# Altium schematic symbol library 724452_RPL-HX_Mobile_AEP_Rev0p91_Library.SchLib: 162 symbols (part 2 of 5)
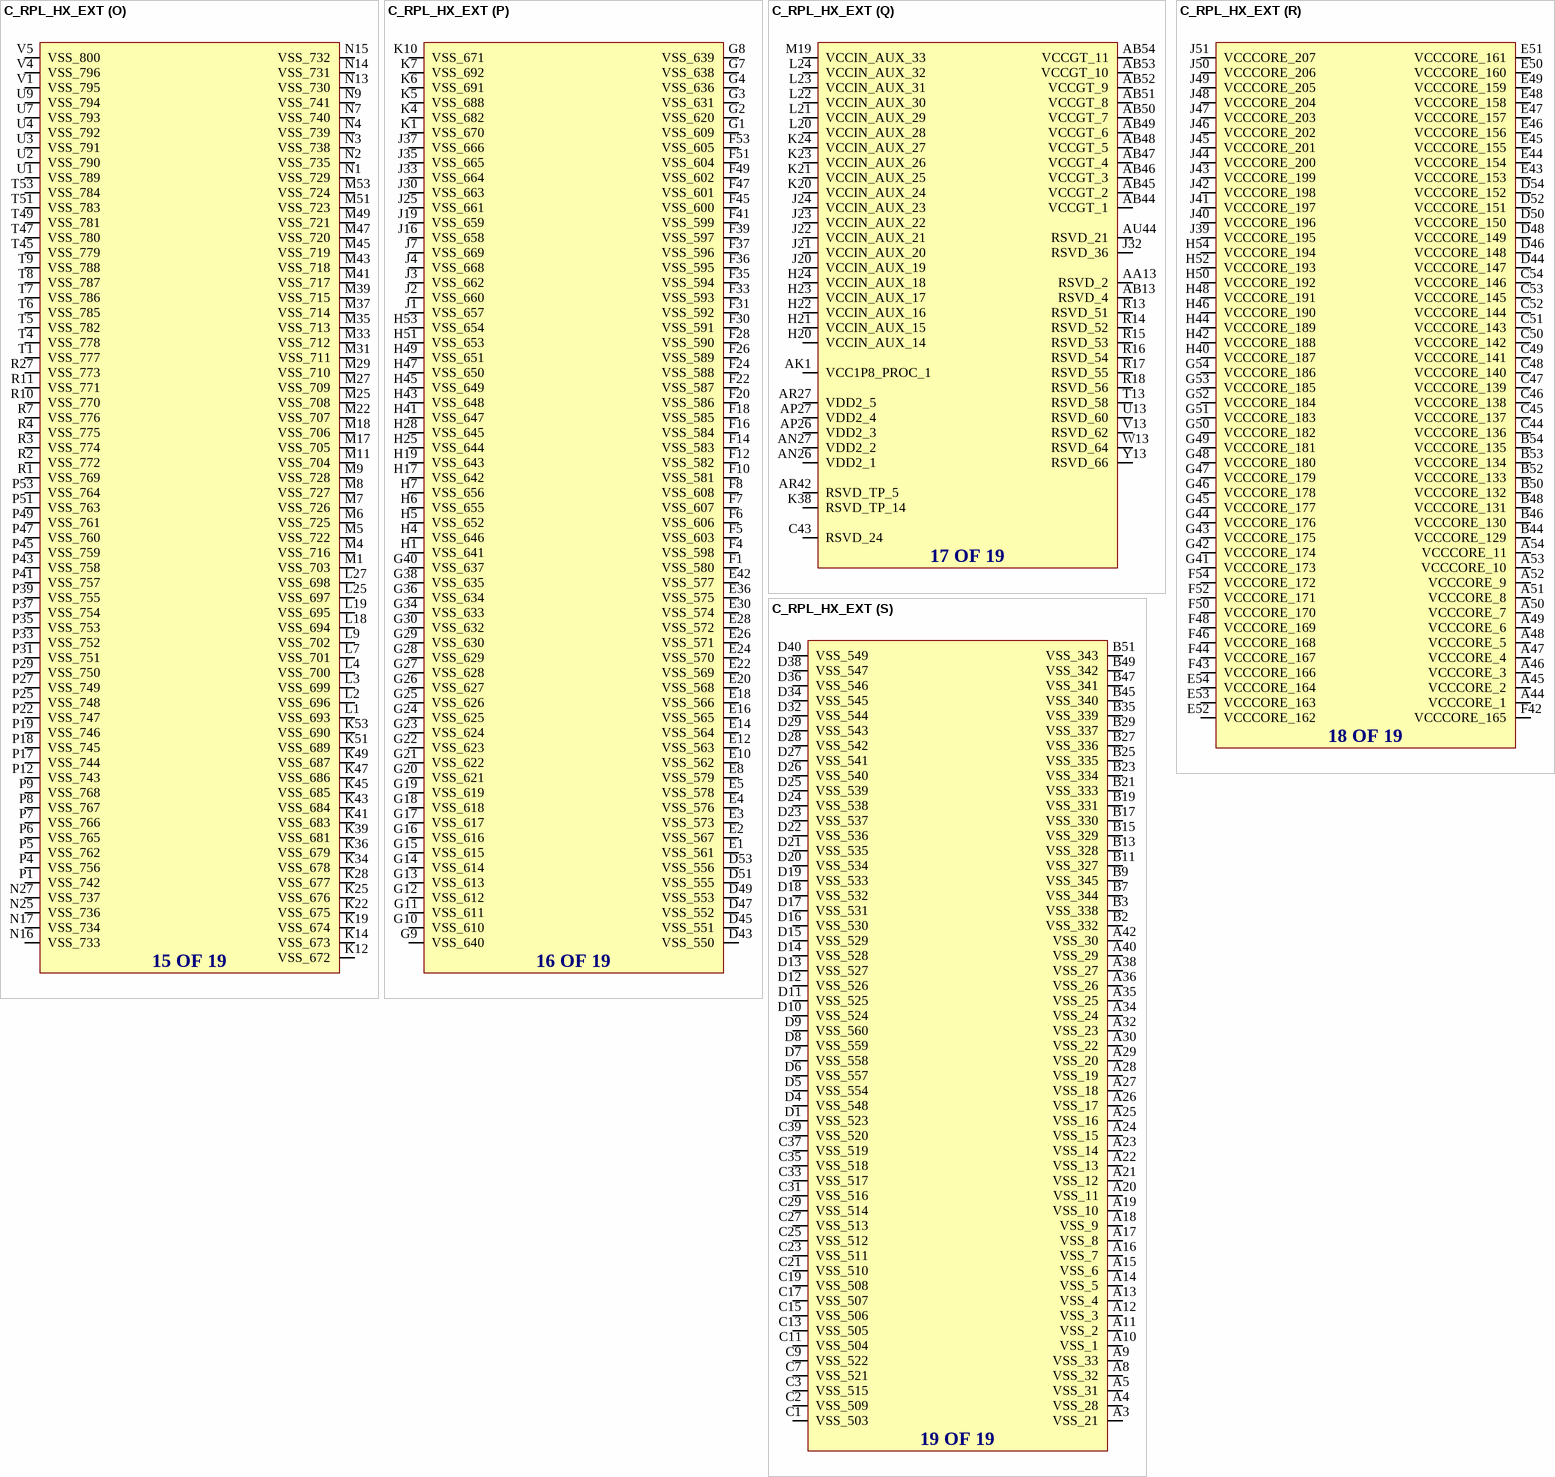
[diagram p44: symbol C_RPL_HX_EXT]

## C_RPL_HX_EXT
designator ?  (value not drawn)
Manufacturer Part Number: *; Case/Package: *
part A pins: AK52 DDR_VREF_CA1, AK54 DDR_VREF_CA0, AM51 DDR0_DQ0_2/DDR0_DQ0_2/DDR0_DQ0_2, AM52 DDR0_DQ0_3/DDR0_DQ0_3/DDR0_DQ0_3, AM53 DDR0_DQ0_1/DDR0_DQ0_1/DDR0_DQ0_1, AN2 DDR0_DQ7_6/DDR1_DQ5_6/DDR1_DQ3_6, AN3 DDR0_DQ7_5/DDR1_DQ5_5/DDR1_DQ3_5, AN4 DDR0_DQ7_4/DDR1_DQ5_4/DDR1_DQ3_4, AN51 DDR0_DQSN0/DDR0_DQSN0/DDR0_DQSN0, AN53 DDR0_DQ0_0/DDR0_DQ0_0/DDR0_DQ0_0, AP2 DDR0_DQ7_7/DDR1_DQ5_7/DDR1_DQ3_7, AP4 DDR0_DQSP7/DDR1_DQSP5/DDR1_DQSP3, AP51 DDR0_DQSP0/DDR0_DQSP0/DDR0_DQSP0, AP53 DDR0_DQ0_5/DDR0_DQ0_5/DDR0_DQ0_5, AR2 DDR0_DQ7_2/DDR1_DQ5_2/DDR1_DQ3_2, AR4 DDR0_DQSN7/DDR1_DQSN5/DDR1_DQSN3, AR51 DDR0_DQ0_6/DDR0_DQ0_6/DDR0_DQ0_6, AR52 DDR0_DQ0_7/DDR0_DQ0_7/DDR0_DQ0_7, AR53 DDR0_DQ0_4/DDR0_DQ0_4/DDR0_DQ0_4, AT2 DDR0_DQ7_3/DDR1_DQ5_3/DDR1_DQ3_3, AT3 DDR0_DQ7_0/DDR1_DQ5_0/DDR1_DQ3_0, AT4 DDR0_DQ7_1/DDR1_DQ5_1/DDR1_DQ3_1, AT25 NC/DDR1_CLKP3, AT26 DDR0_ALERT#, AT31 NC/DDR0_CLKP3, AU24 NC/DDR1_CLKP2, AU25 NC/DDR1_CLKN3, AU31 NC/DDR0_CLKN3, AU32 NC/DDR0_CLKP2, AU51 DDR0_DQ1_2/DDR0_DQ1_2/DDR0_DQ1_2, AU52 DDR0_DQ1_3/DDR0_DQ1_3/DDR0_DQ1_3, AU53 DDR0_DQ1_1/DDR0_DQ1_1/DDR0_DQ1_1, AV2 DDR0_DQ6_6/DDR1_DQ4_6/DDR1_DQ2_6, AV3 DDR0_DQ6_4/DDR1_DQ4_4/DDR1_DQ2_4, AV4 DDR0_DQ6_5/DDR1_DQ4_5/DDR1_DQ2_5, AV24 NC/DDR1_CLKN2, AV32 NC/DDR0_CLKN2, AV51 DDR0_DQSN1/DDR0_DQSN1/DDR0_DQSN1, AV53 DDR0_DQ1_0/DDR0_DQ1_0/DDR0_DQ1_0, AW2 DDR0_DQ6_7/DDR1_DQ4_7/DDR1_DQ2_7, AW4 DDR0_DQSP6/DDR1_DQSP4/DDR1_DQSP2, AW51 DDR0_DQSP1/DDR0_DQSP1/DDR0_DQSP1, AW53 DDR0_DQ1_4/DDR0_DQ1_4/DDR0_DQ1_4, AY2 DDR0_DQ6_2/DDR1_DQ4_2/DDR1_DQ2_2, AY4 DDR0_DQSN6/DDR1_DQSN4/DDR1_DQSN2, AY51 DDR0_DQ1_6/DDR0_DQ1_6/DDR0_DQ1_6, AY52 DDR0_DQ1_7/DDR0_DQ1_7/DDR0_DQ1_7, AY53 DDR0_DQ1_5/DDR0_DQ1_5/DDR0_DQ1_5, BA2 DDR0_DQ6_3/DDR1_DQ4_3/DDR1_DQ2_3, BA3 DDR0_DQ6_0/DDR1_DQ4_0/DDR1_DQ2_0, BA4 DDR0_DQ6_1/DDR1_DQ4_1/DDR1_DQ2_1, BB51 DDR0_DQ2_0/DDR0_DQ4_0/DDR0_DQ2_0, BB52 DDR0_DQ2_1/DDR0_DQ4_1/DDR0_DQ2_1, BB53 DDR0_DQ2_3/DDR0_DQ4_3/DDR0_DQ2_3, BB54 DDR0_DQ2_2/DDR0_DQ4_2/DDR0_DQ2_2, BC2 DDR0_DQ5_6/DDR1_DQ1_6/DDR1_DQ1_6, BC3 DDR0_DQ5_7/DDR1_DQ1_7/DDR1_DQ1_7, BC4 DDR0_DQ5_4/DDR1_DQ1_4/DDR1_DQ1_4, BC5 DDR0_DQ5_5/DDR1_DQ1_5/DDR1_DQ1_5, BC6 DDR0_DQ5_3/DDR1_DQ1_3/DDR1_DQ1_3, BC8 DDR0_DQ4_7/DDR1_DQ0_7/DDR1_DQ0_7, BC9 DDR0_DQSP4/DDR1_DQSP0/DDR1_DQSP0, BC10 DDR0_DQSN4/DDR1_DQSN0/DDR1_DQSN0, BC11 DDR0_DQ4_2/DDR1_DQ0_2/DDR1_DQ0_2, BC13 NC/NC/DDR1_DQSN4, BC14 NC/NC/DDR1_DQSP4, BC16 NC/DDR1_CS3, BC17 DDR0_ODT1/DDR1_CS1, BC19 DDR0_MA15/DDR1_CA4, BC21 DDR0_BA0/DDR1_CA9, BC32 DDR0_MA4/DDR0_CA10, BC34 DDR0_MA11/DDR0_CA5, BC36 DDR0_ACT#/DDR0_CA0, BC38 DDR0_CKE1/DDR0_CS3, BC40 DDR0_DQ8_5/DDR0_DQ8_5/NC, BC41 DDR0_DQSP8/DDR0_DQSP8/DDR0_DQSP4, BC42 DDR0_DQSN8/DDR0_DQSN8/DDR0_DQSN4, BC43 DDR0_DQ8_1/DDR0_DQ8_1/DDR0_DQ4_1, BC45 DDR0_DQ3_5/DDR0_DQ5_5/DDR0_DQ3_5, BC46 DDR0_DQSP3/DDR0_DQSP5/DDR0_DQSP3, BC47 DDR0_DQSN3/DDR0_DQSN5/DDR0_DQSN3, BC48 DDR0_DQ3_1/DDR0_DQ5_1/DDR0_DQ3_1, BC50 DDR0_DQ2_5/DDR0_DQ4_5/DDR0_DQ2_5, BD6 DDR0_DQ5_2/DDR1_DQ1_2/DDR1_DQ1_2, BD8 DDR0_DQ4_4/DDR1_DQ0_4/DDR1_DQ0_4, BD11 DDR0_DQ4_3/DDR1_DQ0_3/DDR1_DQ0_3, BD13 NC/NC/DDR1_DQ4_3, BD15 DDR0_ODT3/NC, BD17 DDR0_CS1/DDR1_CA0, BD19 DDR0_CS2/DDR1_CA5, BD21 DDR0_MA10/DDR1_CA10, BD23 DDR0_CLKN3/DDR1_CLKN0, BD29 DDR0_CLKN1/DDR0_CLKN1, BD33 DDR0_MA5/DDR0_CA9, BD35 DDR0_MA9/DDR0_CA4, BD37 DDR0_CKE2/DDR0_CS1, BD40 DDR0_DQ8_4/DDR0_DQ8_4/NC, BD43 DDR0_DQ8_0/DDR0_DQ8_0/DDR0_DQ4_0, BD45 DDR0_DQ3_4/DDR0_DQ5_4/DDR0_DQ3_4, BD48 DDR0_DQ3_0/DDR0_DQ5_0/DDR0_DQ3_0, BD50 DDR0_DQ2_6/DDR0_DQ4_6/DDR0_DQ2_6, BD51 DDR0_DQSP2/DDR0_DQSP4/DDR0_DQSP2, BD52 DDR0_DQSN2/DDR0_DQSN4/DDR0_DQSN2, BE4 DDR0_DQSP5/DDR1_DQSP1/DDR1_DQSP1, BE5 DDR0_DQSN5/DDR1_DQSN1/DDR1_DQSN1, BE6 DDR0_DQ5_0/DDR1_DQ1_0/DDR1_DQ1_0, BE8 DDR0_DQ4_6/DDR1_DQ0_6/DDR1_DQ0_6, BE9 DDR0_DQ4_5/DDR1_DQ0_5/DDR1_DQ0_5, BE10 DDR0_DQ4_0/DDR1_DQ0_0/DDR1_DQ0_0, BE11 DDR0_DQ4_1/DDR1_DQ0_1/DDR1_DQ0_1, BE13 NC/NC/DDR1_DQ4_2, BE14 NC/NC/DDR1_DQ4_0, BE16 NC/DDR1_CS2, BE17 DDR0_ODT2/DDR1_CA1, BE18 DDR0_MA13/DDR1_CA2, BE19 DDR0_CS0/DDR1_CA6, BE20 DDR0_MA14/DDR1_CA7, BE21 DDR0_BA1/DDR1_CA11, BE22 DDR0_MA0/DDR1_CA12, BE23 DDR0_CLKP3/DDR1_CLKP0, BE24 DDR0_CLKN2/DDR1_CLKN1, BE29 DDR0_CLKP1/DDR0_CLKP1, BE30 DDR0_CLKN0/DDR0_CLKN0, BE31 DDR0_MA2/NC, BE32 DDR0_MA1/DDR0_CA12, BE33 DDR0_MA6/DDR0_CA8, BE34 DDR0_MA8/DDR0_CA7, BE35 DDR0_MA12/DDR0_CA3, BE36 DDR0_BG1/DDR0_CA2, BE37 DDR0_CKE0/DDR0_CS0, BE38 NC/DDR0_CS2, BE40 DDR0_DQ8_6/DDR0_DQ8_6/NC, BE41 DDR0_DQ8_7/DDR0_DQ8_7/NC, BE42 DDR0_DQ8_2/DDR0_DQ8_2/DDR0_DQ4_2, BE43 DDR0_DQ8_3/DDR0_DQ8_3/DDR0_DQ4_3, BE45 DDR0_DQ3_6/DDR0_DQ5_6/DDR0_DQ3_6, BE46 DDR0_DQ3_7/DDR0_DQ5_7/DDR0_DQ3_7, BE47 DDR0_DQ3_2/DDR0_DQ5_2/DDR0_DQ3_2, BE48 DDR0_DQ3_3/DDR0_DQ5_3/DDR0_DQ3_3, BE50 DDR0_DQ2_7/DDR0_DQ4_7/DDR0_DQ2_7, BF6 DDR0_DQ5_1/DDR1_DQ1_1/DDR1_DQ1_1, BF14 NC/NC/DDR1_DQ4_1, BF16 DDR0_CS3/DDR1_CS0, BF18 DDR0_ODT0/DDR1_CA3, BF20 DDR0_MA16/DDR1_CA8, BF22 DDR0_PAR/NC, BF24 DDR0_CLKP2/DDR1_CLKP1, BF30 DDR0_CLKP0/DDR0_CLKP0, BF32 DDR0_MA3/DDR0_CA11, BF34 DDR0_MA7/DDR0_CA6, BF36 DDR0_BG0/DDR0_CA1, BF38 DDR0_CKE3/NC, BF50 DDR0_DQ2_4/DDR0_DQ4_4/DDR0_DQ2_4
part B pins: AK47 DDR1_DQ0_1/DDR0_DQ2_1/DDR2_DQ0_1, AK48 DDR1_DQ0_0/DDR0_DQ2_0/DDR2_DQ0_0, AK49 DDR1_DQ0_3/DDR0_DQ2_3/DDR2_DQ0_3, AK51 DDR_VREF_CA3, AK53 DDR_VREF_CA2, AL47 DDR1_DQSN0/DDR0_DQSN2/DDR2_DQSN0, AL49 DDR1_DQ0_2/DDR0_DQ2_2/DDR2_DQ0_2, AM47 DDR1_DQSP0/DDR0_DQSP2/DDR2_DQSP0, AM49 DDR1_DQ0_5/DDR0_DQ2_5/DDR2_DQ0_5, AN6 DDR1_DQ7_5/DDR1_DQ7_5/DDR3_DQ3_5, AN7 DDR1_DQ7_7/DDR1_DQ7_7/DDR3_DQ3_7, AN8 DDR1_DQ7_4/DDR1_DQ7_4/DDR3_DQ3_4, AN47 DDR1_DQ0_7/DDR0_DQ2_7/DDR2_DQ0_7, AN48 DDR1_DQ0_6/DDR0_DQ2_6/DDR2_DQ0_6, AN49 DDR1_DQ0_4/DDR0_DQ2_4/DDR2_DQ0_4, AP6 DDR1_DQ7_6/DDR1_DQ7_6/DDR3_DQ3_6, AP8 DDR1_DQSP7/DDR1_DQSP7/DDR3_DQSP3, AR6 DDR1_DQ7_2/DDR1_DQ7_2/DDR3_DQ3_2, AR8 DDR1_DQSN7/DDR1_DQSN7/DDR3_DQSN3, AR46 DDR1_DQSN1/DDR0_DQSN3/DDR2_DQSN1, AR47 DDR1_DQ1_2/DDR0_DQ3_2/DDR2_DQ1_2, AR48 DDR1_DQ1_3/DDR0_DQ3_3/DDR2_DQ1_3, AR49 DDR1_DQ1_1/DDR0_DQ3_1/DDR2_DQ1_1, AT6 DDR1_DQ7_3/DDR1_DQ7_3/DDR3_DQ3_3, AT7 DDR1_DQ7_1/DDR1_DQ7_1/DDR3_DQ3_1, AT8 DDR1_DQ7_0/DDR1_DQ7_0/DDR3_DQ3_0, AT22 NC/DDR3_CLKN3, AT23 NC/DDR3_CLKP3, AT27 DDR1_ALERT#, AT33 NC/DDR2_CLKP3, AT34 NC/DDR2_CLKN3, AT46 DDR1_DQSP1/DDR0_DQSP3/DDR2_DQSP1, AT49 DDR1_DQ1_0/DDR0_DQ3_0/DDR2_DQ1_0, AU19 NC/NC/DDR3_DQSP4, AU20 NC/NC/DDR3_DQSN4, AU22 NC/DDR3_CLKP2, AU27 DDR1_ODT2/DDR3_CA1, AU28 DDR1_PAR/NC, AU34 NC/DDR2_CLKP2, AU46 DDR1_DQ1_6/DDR0_DQ3_6/DDR2_DQ1_6, AU47 DDR1_DQ1_7/DDR0_DQ3_7/DDR2_DQ1_7, AU48 DDR1_DQ1_4/DDR0_DQ3_4/DDR2_DQ1_4, AU49 DDR1_DQ1_5/DDR0_DQ3_5/DDR2_DQ1_5, AV6 DDR1_DQ6_4/DDR1_DQ6_4/DDR3_DQ2_4, AV7 DDR1_DQ6_6/DDR1_DQ6_6/DDR3_DQ2_6, AV8 DDR1_DQ6_7/DDR1_DQ6_7/DDR3_DQ2_7, AV15 DDR1_DQ4_7/DDR1_DQ2_7/DDR3_DQ0_7, AV16 DDR1_DQ4_2/DDR1_DQ2_2/DDR3_DQ0_2, AV17 DDR1_DQ4_0/DDR1_DQ2_0/DDR3_DQ0_0, AV19 NC/NC/DDR3_DQ4_0, AV22 NC/DDR3_CLKN2, AV26 DDR1_MA14/DDR3_CA7, AV28 DDR1_MA2/NC, AV30 DDR1_CKE3/NC, AV34 NC/DDR2_CLKN2, AV37 DDR1_DQSP8/DDR1_DQSP8/DDR2_DQSP4, AV38 DDR1_DQSN8/DDR1_DQSN8/DDR2_DQSN4, AV39 DDR1_DQ8_0/DDR1_DQ8_0/DDR2_DQ4_0, AW6 DDR1_DQ6_5/DDR1_DQ6_5/DDR3_DQ2_5, AW8 DDR1_DQ6_2/DDR1_DQ6_2/DDR3_DQ2_2, AW10 DDR1_DQ5_4/DDR1_DQ3_4/DDR3_DQ1_4, AW11 DDR1_DQSP5/DDR1_DQSP3/DDR3_DQSP1, AW12 DDR1_DQSN5/DDR1_DQSN3/DDR3_DQSN1, AW13 DDR1_DQ5_3/DDR1_DQ3_3/DDR3_DQ1_3, AW15 DDR1_DQ4_6/DDR1_DQ2_6/DDR3_DQ0_6, AW17 DDR1_DQ4_3/DDR1_DQ2_3/DDR3_DQ0_3, AW19 NC/NC/DDR3_DQ4_2, AW21 NC/DDR3_CS3, AW23 DDR1_CS1/DDR3_CA0, AW24 DDR1_MA13/DDR3_CA2, AW25 DDR1_CS2/DDR3_CA5, AW26 DDR1_MA10/DDR3_CA10, AW27 DDR1_MA0/DDR3_CA12, AW28 DDR1_MA4/DDR2_CA10, AW29 DDR1_MA5/DDR2_CA9, AW30 DDR1_MA11/DDR2_CA5, AW31 DDR1_MA12/DDR2_CA3, AW32 DDR1_ACT#/DDR2_CA0, AW35 DDR1_CKE0/DDR2_CS0, AW37 DDR1_DQ8_7/DDR1_DQ8_7/NC, AW39 DDR1_DQ8_1/DDR1_DQ8_1/DDR2_DQ4_1, AW41 DDR1_DQ3_5/DDR0_DQ7_5/DDR2_DQ3_5, AW42 DDR1_DQSP3/DDR0_DQSP7/DDR2_DQSP3, AW43 DDR1_DQSN3/DDR0_DQSN7/DDR2_DQSN3, AW44 DDR1_DQ3_0/DDR0_DQ7_0/DDR2_DQ3_0, AW46 DDR1_DQ2_2/DDR0_DQ6_2/DDR2_DQ2_2, AW47 DDR1_DQSP2/DDR0_DQSP6/DDR2_DQSP2, AW48 DDR1_DQSN2/DDR0_DQSN6/DDR2_DQSN2, AW49 DDR1_DQ2_1/DDR0_DQ6_1/DDR2_DQ2_1, AY6 DDR1_DQSP6/DDR1_DQSP6/DDR3_DQSP2, AY8 DDR1_DQ6_1/DDR1_DQ6_1/DDR3_DQ2_1, AY10 DDR1_DQ5_6/DDR1_DQ3_6/DDR3_DQ1_6, AY13 DDR1_DQ5_2/DDR1_DQ3_2/DDR3_DQ1_2, AY15 DDR1_DQ4_4/DDR1_DQ2_4/DDR3_DQ0_4, AY17 DDR1_DQ4_1/DDR1_DQ2_1/DDR3_DQ0_1, AY19 NC/NC/DDR3_DQ4_3, AY21 NC/DDR3_CS2, AY25 DDR1_CS0/DDR3_CA6, AY27 DDR1_BA1/DDR3_CA11, AY29 DDR1_MA6/DDR2_CA8, AY31 DDR1_MA9/DDR2_CA4, AY34 DDR1_CKE2/DDR2_CS1, AY35 DDR1_CKE1/DDR2_CS3, AY37 DDR1_DQ8_6/DDR1_DQ8_6/NC, AY39 DDR1_DQ8_3/DDR1_DQ8_3/DDR2_DQ4_3, AY41 DDR1_DQ3_4/DDR0_DQ7_4/DDR2_DQ3_4, AY44 DDR1_DQ3_1/DDR0_DQ7_1/DDR2_DQ3_1, AY46 DDR1_DQ2_5/DDR0_DQ6_5/DDR2_DQ2_5, AY49 DDR1_DQ2_0/DDR0_DQ6_0/DDR2_DQ2_0, BA6 DDR1_DQSN6/DDR1_DQSN6/DDR3_DQSN2, BA7 DDR1_DQ6_3/DDR1_DQ6_3/DDR3_DQ2_3, BA8 DDR1_DQ6_0/DDR1_DQ6_0/DDR3_DQ2_0, BA10 DDR1_DQ5_7/DDR1_DQ3_7/DDR3_DQ1_7, BA11 DDR1_DQ5_5/DDR1_DQ3_5/DDR3_DQ1_5, BA12 DDR1_DQ5_1/DDR1_DQ3_1/DDR3_DQ1_1, BA13 DDR1_DQ5_0/DDR1_DQ3_0/DDR3_DQ1_0, BA15 DDR1_DQ4_5/DDR1_DQ2_5/DDR3_DQ0_5, BA16 DDR1_DQSP4/DDR1_DQSP2/DDR3_DQSP0, BA17 DDR1_DQSN4/DDR1_DQSN2/DDR3_DQSN0, BA19 NC/NC/DDR3_DQ4_1, BA21 DDR1_ODT3/NC, BA22 DDR1_ODT1/DDR3_CS1, BA23 DDR1_CS3/DDR3_CS0, BA24 DDR1_MA15/DDR3_CA4, BA25 DDR1_ODT0/DDR3_CA3, BA26 DDR1_BA0/DDR3_CA9, BA27 DDR1_MA16/DDR3_CA8, BA28 DDR1_MA1/DDR2_CA12, BA29 DDR1_MA3/DDR2_CA11, BA30 DDR1_MA8/DDR2_CA7, BA31 DDR1_MA7/DDR2_CA6, BA32 DDR1_BG1/DDR2_CA2, BA33 DDR1_BG0/DDR2_CA1, BA34 NC/DDR2_CS2, BA37 DDR1_DQ8_4/DDR1_DQ8_4/NC, BA38 DDR1_DQ8_5/DDR1_DQ8_5/NC, BA39 DDR1_DQ8_2/DDR1_DQ8_2/DDR2_DQ4_2, BA41 DDR1_DQ3_6/DDR0_DQ7_6/DDR2_DQ3_6, BA42 DDR1_DQ3_7/DDR0_DQ7_7/DDR2_DQ3_7, BA43 DDR1_DQ3_2/DDR0_DQ7_2/DDR2_DQ3_2, BA44 DDR1_DQ3_3/DDR0_DQ7_3/DDR2_DQ3_3, BA46 DDR1_DQ2_6/DDR0_DQ6_6/DDR2_DQ2_6, BA47 DDR1_DQ2_7/DDR0_DQ6_7/DDR2_DQ2_7, BA48 DDR1_DQ2_4/DDR0_DQ6_4/DDR2_DQ2_4, BA49 DDR1_DQ2_3/DDR0_DQ6_3/DDR2_DQ2_3, BD25 DDR1_CLKN2/DDR3_CLKN0, BD27 DDR1_CLKN1/DDR2_CLKN1, BE25 DDR1_CLKP2/DDR3_CLKP0, BE26 DDR1_CLKN3/DDR3_CLKN1, BE27 DDR1_CLKP1/DDR2_CLKP1, BE28 DDR1_CLKN0/DDR2_CLKN0, BF26 DDR1_CLKP3/DDR3_CLKP1, BF28 DDR1_CLKP0/DDR2_CLKP0
part C pins: AA5 PCIE_X16_TXP_15, AA6 PCIE_X16_TXN_15, AB1 DMI_TXP_7, AB2 DMI_TXN_7, AC3 DMI_TXP_6, AC4 DMI_TXN_6, AC6 DMI_RXP_7, AC7 DMI_RXN_7, AD1 DMI_TXP_5, AD2 DMI_TXN_5, AD7 DMI_RXP_6, AD8 DMI_RXN_6, AE3 DMI_TXP_4, AE4 DMI_TXN_4, AE6 DMI_RXP_5, AE7 DMI_RXN_5, AF1 DMI_TXP_3, AF2 DMI_TXN_3, AF7 DMI_RXP_4, AF8 DMI_RXN_4, AG3 DMI_TXP_2, AG4 DMI_TXN_2, AG6 DMI_RXP_3, AG7 DMI_RXN_3, AH1 DMI_TXP_1, AH2 DMI_TXN_1, AH7 DMI_RXP_2, AH8 DMI_RXN_2, AJ3 DMI_TXP_0, AJ4 DMI_TXN_0, AJ6 DMI_RXP_1, AJ7 DMI_RXN_1, AK7 DMI_RXP_0, AK8 DMI_RXN_0, B8 PCIE_X16_RXP_6, B10 PCIE_X16_RXP_5, B12 PCIE_X16_RXP_4, B14 PCIE_X16_RXP_3, B16 PCIE_X16_RXP_2, B18 PCIE_X16_RXP_1, B20 PCIE_X16_RXP_0, B22 PCIE_X4_RXP_3, B24 PCIE_X4_RXP_2, B26 PCIE_X4_RXP_1, B28 PCIE_X4_RXP_0, C8 PCIE_X16_RXN_6, C10 PCIE_X16_RXN_5, C12 PCIE_X16_RXN_4, C14 PCIE_X16_RXN_3, C16 PCIE_X16_RXN_2, C18 PCIE_X16_RXN_1, C20 PCIE_X16_RXN_0, C22 PCIE_X4_RXN_3, C24 PCIE_X4_RXN_2, C26 PCIE_X4_RXN_1, C28 PCIE_X4_RXN_0, D2 PCIE_X16_RXP_7, D3 PCIE_X16_RXN_7, E6 PCIE_X16_TXP_7, E7 PCIE_X16_TXN_7, E9 PCIE_X16_TXP_6, E11 PCIE_X16_TXP_5, E13 PCIE_X16_TXP_4, E15 PCIE_X16_TXP_3, E17 PCIE_X16_TXP_2, E19 PCIE_X16_TXP_1, E21 PCIE_X16_TXP_0, E23 PCIE_X4_TXP_3, E25 PCIE_X4_TXP_2, E27 PCIE_X4_TXP_1, E29 PCIE_X4_TXP_0, F2 PCIE_X16_RXP_8, F3 PCIE_X16_RXN_8, F9 PCIE_X16_TXN_6, F11 PCIE_X16_TXN_5, F13 PCIE_X16_TXN_4, F15 PCIE_X16_TXN_3, F17 PCIE_X16_TXN_2, F19 PCIE_X16_TXN_1, F21 PCIE_X16_TXN_0, F23 PCIE_X4_TXN_3, F25 PCIE_X4_TXN_2, F27 PCIE_X4_TXN_1, F29 PCIE_X4_TXN_0, G5 PCIE_X16_TXP_8, G6 PCIE_X16_TXN_8, H2 PCIE_X16_RXP_9, H3 PCIE_X16_RXN_9, J5 PCIE_X16_TXP_9, J6 PCIE_X16_TXN_9, K2 PCIE_X16_RXP_10, K3 PCIE_X16_RXN_10, L5 PCIE_X16_TXP_10, L6 PCIE_X16_TXN_10, M2 PCIE_X16_RXP_11, M3 PCIE_X16_RXN_11, N5 PCIE_X16_TXP_11, N6 PCIE_X16_TXN_11, P2 PCIE_X16_RXP_12, P3 PCIE_X16_RXN_12, R5 PCIE_X16_TXP_12, R6 PCIE_X16_TXN_12, T2 PCIE_X16_RXP_13, T3 PCIE_X16_RXN_13, U5 PCIE_X16_TXP_13, U6 PCIE_X16_TXN_13, V2 PCIE_X16_RXP_14, V3 PCIE_X16_RXN_14, W5 PCIE_X16_TXP_14, W6 PCIE_X16_TXN_14, Y2 PCIE_X16_RXP_15, Y3 PCIE_X16_RXN_15
part D pins: A31 DDIB_TXP_2, A33 DDIB_TXP_0, A37 DDID_TXP_2, A39 DDID_TXP_0, B30 DDIB_TXP_3, B31 DDIB_TXN_2, B32 DDIB_TXP_1, B33 DDIB_TXN_0, B34 DDIB_AUXP, B36 DDID_TXP_3, B37 DDID_TXN_2, B38 DDID_TXP_1, B39 DDID_TXN_0, B40 DDID_AUXP, C30 DDIB_TXN_3, C32 DDIB_TXN_1, C34 DDIB_AUXN, C36 DDID_TXN_3, C38 DDID_TXN_1, C40 DDID_AUXN, D31 DDIA_TXN_3, D33 DDIA_TXN_1, D35 DDIA_AUXN, D37 DDIC_TXN_3, D39 DDIC_TXN_1, D41 DDIC_AUXN, E31 DDIA_TXP_3, E32 DDIA_TXN_2, E33 DDIA_TXP_1, E34 DDIA_TXN_0, E35 DDIA_AUXP, E37 DDIC_TXP_3, E38 DDIC_TXN_2, E39 DDIC_TXP_1, E40 DDIC_TXN_0, E41 DDIC_AUXP, F32 DDIA_TXP_2, F34 DDIA_TXP_0, F38 DDIC_TXP_2, F40 DDIC_TXP_0, G33 DDIE_TXN_3, G35 DDIE_TXN_1, G37 DDIE_AUXN, H33 DDIE_TXP_3, H34 DDIE_TXN_2, H35 DDIE_TXP_1, H36 DDIE_TXN_0, H37 DDIE_AUXP, J27 RSVD_32, J28 RSVD_33, J34 DDIE_TXP_2, J36 DDIE_TXP_0, K18 DISP_UTILS_1, M13 PROC_AUDIN, M14 PROC_AUDCLK, M15 PROC_AUDOUT, M16 DISP_UTILS_2
part E pins: A41 VIDSCK, AA8 CLK_NSSC_N, AA10 PCI_BCLKN, AJ54 DDR_VTT_CTL, B5 PROCPWRGD, B6 PECI, B41 VIDALERT#, C4 THERMTRIP#, C5 RESET#, C6 VCCST_PWRGD, C41 PROCHOT#, C42 VIDSOUT, D42 SKTOCC#, G32 CPU_ID, H8 BPM#_3, H9 PROC_TMS, H10 PROC_JTAG_TRST#, H11 CFG_0, H12 CFG_5, H13 CFG_4, H14 CFG_10, H15 CFG_11, H16 CFG_17, J8 BPM#_2, J9 PROC_TCK, J10 PROC_TDI, J11 CFG_2, J12 CFG_3, J13 CFG_6, J14 CFG_9, J15 CFG_13, J17 PM_SYNC, K8 BPM#_0, K9 PROC_TDO, K11 CFG_16, K13 CFG_8, K15 CFG_15, K16 PM_DOWN, K17 CATERR#, L8 BPM#_1, L10 PROC_PRDY#, L12 CFG_1, L13 CFG_7, L14 CFG_12, L15 CFG_14, L16 RSVD_42, L17 RSVD_43, M10 PROC_PREQ#, N10 EAR#, U8 BCLK_P, V8 BCLK_N, Y8 CLK_NSSC_P, Y10 PCI_BCLKP
part F pins: A6 PROC_TRIGOUT, A7 PROC_TRIGIN, AA12 RSVD_1, AB12 RSVD_3, AD5 RSVD_TP_1, AF5 RSVD_TP_2, AK5 RSVD_5, AL5 RSVD_6, AR16 RSVD_7, AR20 RSVD_8, AR21 RSVD_9, AR35 RSVD_TP_4, AR44 RSVD_TP_6, AT16 RSVD_TP_7, AT17 RSVD_TP_8, AT28 RSVD_10, AT29 RSVD_11, AT30 RSVD_12, AT42 RSVD_13, AT43 RSVD_14, AU10 RSVD_16, AU29 RSVD_17, AU40 RSVD_18, AU41 RSVD_19, AU42 RSVD_TP_9, AU43 RSVD_20, AW22 RSVD_22, B42 RSVD_23, D30 RSVD_25, G31 RSVD_26, G39 RSVD_27, H18 RSVD_TP_10, H29 RSVD_TP_11, H30 IST_TP_1, H31 IST_TP_0, H32 RSVD_28, H38 RSVD_29, H39 RSVD_30, J18 RSVD_TP_12, J26 RSVD_31, J29 RSVD_34, J38 VSS_667, K26 RSVD_37, K27 RSVD_38, K29 RSVD_39, K30 RSVD_40, K35 RSVD_TP_13, K37 VSS_680, L11 RSVD_41, M12 RSVD_44, N8 RTC_CLK, N11 RSVD_45, N12 VCC_CFG_PU_OUT, P10 RSVD_TP_15, P11 RSVD_TP_16, P13 RSVD_46, P14 RSVD_47, P15 RSVD_48, P16 RSVD_49, R12 RSVD_50, T12 RSVD_57, U12 RSVD_59, V12 RSVD_61, W12 RSVD_63, Y12 RSVD_65
part G pins: AC44 VCCGT_12, AC46 VCCGT_13, AC48 VCCGT_14, AC50 VCCGT_15, AC52 VCCGT_16, AC54 VCCGT_17, AD44 VCCGT_18, AD45 VCCGT_19, AD46 VCCGT_20, AD47 VCCGT_21, AD48 VCCGT_22, AD49 VCCGT_23, AD50 VCCGT_24, AD51 VCCGT_25, AD52 VCCGT_26, AD53 VCCGT_27, AD54 VCCGT_28, AE44 VCCGT_29, AE46 VCCGT_30, AE48 VCCGT_31, AE50 VCCGT_32, AE52 VCCGT_33, AE54 VCCGT_34, AF44 VCCGT_35, AF45 VCCGT_36, AF46 VCCGT_37, AF47 VCCGT_38, AF48 VCCGT_39, AF49 VCCGT_40, AF50 VCCGT_41, AF51 VCCGT_42, AF52 VCCGT_43, AF53 VCCGT_44, AF54 VCCGT_45, AG44 VCCGT_46, AG46 VCCGT_47, AG48 VCCGT_48, AG50 VCCGT_49, AG52 VCCGT_50, AG54 VCCGT_51, AH44 VCCGT_52, AH45 VCCGT_53, AH46 VCCGT_54, AH47 VCCGT_55, AH48 VCCGT_56, AH49 VCCGT_57, AH50 VCCGT_58, AH51 VCCGT_59, AH52 VCCGT_60, AH53 VCCGT_61, AH54 VCCGT_62, AJ52 VCCGT_SENSE, AJ53 VCCGT_VSS_SENSE, AK2 VCC1P8_PROC_2, AK44 VCCIN_AUX_1, AK45 VCCIN_AUX_2, AL1 VCC1P8_PROC_3, AL2 RSVD_TP_3, AL44 VCCIN_AUX_3, AL45 VCCIN_AUX_4, AM44 VCCIN_AUX_5, AM45 VCCIN_AUX_6, AN42 VCCIN_AUX_7, AN43 VCCIN_AUX_8, AN44 VCCIN_AUX_9, AN45 VCCIN_AUX_10, AP42 VCCIN_AUX_11, AP43 VCCIN_AUX_12, AP44 VCCIN_AUX_13, AT44 RSVD_15, B4 VCCST_PWRGD_SX, BC23 VDD2_6, BC24 VDD2_7, BC25 VDD2_8, BC26 VDD2_9, BC27 VDD2_10, BC28 VDD2_11, BC29 VDD2_12, BC30 VDD2_13, BC31 VDD2_DDR5_SENSE, BD16 VDD2_14, BD18 VDD2_15, BD20 VDD2_16, BD22 VDD2_17, BD31 VDD2_18, BD32 VDD2_19, BD34 VDD2_20, BD36 VDD2_21, BD38 VDD2_22, H26 VCCIN_AUX_SENSE, H27 VSSIN_AUX_SENSE, J31 RSVD_35, L26 VCCIN_AUX_FLTR_1, M20 VCCIN_AUX_34, M21 VCCIN_AUX_35, M23 VCCIN_AUX_36, M24 VCCIN_AUX_37, M26 VCCIN_AUX_FLTR_2, N18 VCCIN_AUX_38, N19 VCCIN_AUX_39, N20 VCCIN_AUX_40, N21 VCCIN_AUX_41, N22 VCCIN_AUX_42, N23 VCCIN_AUX_43, N24 VCCIN_AUX_44, N26 VCCIN_AUX_FLTR_3, P20 VCCIN_AUX_45, P21 VCCIN_AUX_46, P23 VCCIN_AUX_47, P24 VCCIN_AUX_48, P26 VCCIN_AUX_FLTR_4, R8 VCC1P05_PROC_1, R9 VCC1P05_PROC_2, R26 VCCIN_AUX_FLTR_5, T10 VCC1P05_PROC_SENSE, T11 VCC1P05_PROC_3, U10 VCC1P05_PROC_4, U11 VCC1P05_PROC_5, V10 VCC1P05_PROC_6, V11 VCC1P05_PROC_7
part H pins: AG12 VCCCORE_35, AG13 VCCCORE_36, AH10 VCCCORE_37, AH11 VCCCORE_38, AH12 VCCCORE_39, AH13 VCCCORE_40, AJ10 VCCCORE_41, AJ12 VCCCORE_42, AJ13 VCCCORE_43, AK10 VCCCORE_44, AK11 VCCCORE_45, AK12 VCCCORE_46, AK13 VCCCORE_47, AL10 VCCCORE_48, AL12 VCCCORE_49, AL13 VCCCORE_50, AM10 VCCCORE_51, AM11 VCCCORE_52, AM12 VCCCORE_53, AM13 VCCCORE_54, AN10 VCCCORE_55, AN12 VCCCORE_56, AN13 VCCCORE_57, AN14 VCCCORE_58, AN15 VCCCORE_59, AN16 VCCCORE_60, AN17 VCCCORE_61, AN18 VCCCORE_62, AN19 VCCCORE_63, AN20 VCCCORE_64, AN21 VCCCORE_65, AN22 VCCCORE_66, AN23 VCCCORE_67, AN24 VCCCORE_68, AN29 VCCCORE_69, AN30 VCCCORE_70, AN31 VCCCORE_71, AN32 VCCCORE_72, AN33 VCCCORE_73, AN34 VCCCORE_74, AN35 VCCCORE_75, AN36 VCCCORE_76, AN37 VCCCORE_77, AN38 VCCCORE_78, AN39 VCCCORE_79, AN40 VCCCORE_80, AP10 VCCCORE_81, AP11 VCCCORE_82, AP12 VCCCORE_83, AP13 VCCCORE_84, AP14 VCCCORE_85, AP15 VCCCORE_86, AP16 VCCCORE_87, AP17 VCCCORE_88, AP18 VCCCORE_89, AP19 VCCCORE_90, AP20 VCCCORE_91, AP21 VCCCORE_92, AP22 VCCCORE_93, AP23 VCCCORE_94, AP24 VCCCORE_95, AP29 VCCCORE_96, AP30 VCCCORE_97, AP31 VCCCORE_98, AP32 VCCCORE_99, AP33 VCCCORE_100, AP34 VCCCORE_101, AP35 VCCCORE_102, AP36 VCCCORE_103, AP37 VCCCORE_104, AP38 VCCCORE_105, AP39 VCCCORE_106, AP40 VCCCORE_107, AR10 VCCCORE_108, AR12 VCCCORE_109, AR14 VCCCORE_110, AR18 VCCCORE_111, AR19 VCCCORE_112, AR37 VCCCORE_113, AR39 VCCCORE_114, AR40 VCCCORE_115, AT10 VCCCORE_116, AT11 VCCCORE_117, AT12 VCCCORE_118, AT13 VCCCORE_119, AT14 VCCCORE_120, AT15 VCCCORE_121, AT37 VCCCORE_122, AT38 VCCCORE_123, AT39 VCCCORE_124, AT40 VCCCORE_125, AU11 VCCCORE_126, AU12 VCCCORE_127, AU13 VCCCORE_128
part I pins: AA44 VCCCORE_12, AA45 VCCCORE_13, AA46 VCCCORE_14, AA47 VCCCORE_15, AA48 VCCCORE_16, AA49 VCCCORE_17, AA50 VCCCORE_18, AA51 VCCCORE_19, AA52 VCCCORE_20, AA53 VCCCORE_21, AA54 VCCCORE_22, AD10 VCCCORE_23, AD11 VCCCORE_24, AD12 VCCCORE_25, AD13 VCCCORE_26, AE10 VCCCORE_27, AE12 VCCCORE_28, AE13 VCCCORE_29, AF10 VCCCORE_30, AF11 VCCCORE_31, AF12 VCCCORE_32, AF13 VCCCORE_33, AG10 VCCCORE_34, P50 VCCCORE_301, P52 VCCCORE_302, P54 VCCCORE_303, R28 VCCCORE_304, R29 VCCCORE_305, R30 VCCCORE_306, R31 VCCCORE_307, R32 VCCCORE_308, R33 VCCCORE_309, R34 VCCCORE_310, R35 VCCCORE_311, R36 VCCCORE_312, R37 VCCCORE_313, R38 VCCCORE_314, R39 VCCCORE_315, R40 VCCCORE_316, R41 VCCCORE_317, R42 VCCCORE_318, R43 VCCCORE_319, R44 VCCCORE_320, R45 VCCCORE_321, R46 VCCCORE_322, R47 VCCCORE_323, R48 VCCCORE_324, R49 VCCCORE_325, R50 VCCCORE_326, R51 VCCCORE_327, R52 VCCCORE_328, R53 VCCCORE_329, R54 VCCCORE_330, T44 VCCCORE_331, T46 VCCCORE_332, T48 VCCCORE_333, T50 VCCCORE_334, T52 VCCCORE_335, T54 VCCCORE_336, U44 VCCCORE_337, U45 VCCCORE_338, U46 VCCCORE_339, U47 VCCCORE_340, U48 VCCCORE_341, U49 VCCCORE_342, U50 VCCCORE_343, U51 VCCCORE_344, U52 VCCCORE_345, U53 VCCCORE_346, U54 VCCCORE_347, V44 VCCCORE_348, V46 VCCCORE_349, V48 VCCCORE_350, V50 VCCCORE_351, V52 VCCCORE_352, V54 VCCCORE_353, W44 VCCCORE_354, W45 VCCCORE_355, W46 VCCCORE_356, W47 VCCCORE_357, W48 VCCCORE_358, W49 VCCCORE_359, W50 VCCCORE_360, W51 VCCCORE_361, W52 VCCCORE_362, W53 VCCCORE_363, W54 VCCCORE_364, Y44 VCCCORE_365, Y46 VCCCORE_366, Y48 VCCCORE_367, Y50 VCCCORE_368, Y52 VCCCORE_369, Y54 VCCCORE_370
part J pins: A43 VCCCORE_SENSE, B43 VCCCORE_VSS_SENSE, J52 VCCCORE_208, J53 VCCCORE_209, J54 VCCCORE_210, K31 VCCCORE_211, K32 VCCCORE_212, K33 VCCCORE_213, K40 VCCCORE_214, K42 VCCCORE_215, K44 VCCCORE_216, K46 VCCCORE_217, K48 VCCCORE_218, K50 VCCCORE_219, K52 VCCCORE_220, K54 VCCCORE_221, L28 VCCCORE_222, L29 VCCCORE_223, L30 VCCCORE_224, L31 VCCCORE_225, L32 VCCCORE_226, L33 VCCCORE_227, L34 VCCCORE_228, L35 VCCCORE_229, L36 VCCCORE_230, L37 VCCCORE_231, L38 VCCCORE_232, L39 VCCCORE_233, L40 VCCCORE_234, L41 VCCCORE_235, L42 VCCCORE_236, L43 VCCCORE_237, L44 VCCCORE_238, L45 VCCCORE_239, L46 VCCCORE_240, L47 VCCCORE_241, L48 VCCCORE_242, L49 VCCCORE_243, L50 VCCCORE_244, L51 VCCCORE_245, L52 VCCCORE_246, L53 VCCCORE_247, L54 VCCCORE_248, M28 VCCCORE_249, M30 VCCCORE_250, M32 VCCCORE_251, M34 VCCCORE_252, M36 VCCCORE_253, M38 VCCCORE_254, M40 VCCCORE_255, M42 VCCCORE_256, M44 VCCCORE_257, M46 VCCCORE_258, M48 VCCCORE_259, M50 VCCCORE_260, M52 VCCCORE_261, M54 VCCCORE_262, N28 VCCCORE_263, N29 VCCCORE_264, N30 VCCCORE_265, N31 VCCCORE_266, N32 VCCCORE_267, N33 VCCCORE_268, N34 VCCCORE_269, N35 VCCCORE_270, N36 VCCCORE_271, N37 VCCCORE_272, N38 VCCCORE_273, N39 VCCCORE_274, N40 VCCCORE_275, N41 VCCCORE_276, N42 VCCCORE_277, N43 VCCCORE_278, N44 VCCCORE_279, N45 VCCCORE_280, N46 VCCCORE_281, N47 VCCCORE_282, N48 VCCCORE_283, N49 VCCCORE_284, N50 VCCCORE_285, N51 VCCCORE_286, N52 VCCCORE_287, N53 VCCCORE_288, N54 VCCCORE_289, P28 VCCCORE_290, P30 VCCCORE_291, P32 VCCCORE_292, P34 VCCCORE_293, P36 VCCCORE_294, P38 VCCCORE_295, P40 VCCCORE_296, P42 VCCCORE_297, P44 VCCCORE_298, P46 VCCCORE_299, P48 VCCCORE_300
part K pins: BB25 VSS_378, BB26 VSS_379, BB27 VSS_380, BB28 VSS_381, BB29 VSS_382, BB30 VSS_384, BB31 VSS_385, BB32 VSS_386, BB33 VSS_387, BB34 VSS_388, BB35 VSS_389, BB36 VSS_390, BB37 VSS_391, BB38 VSS_392, BB39 VSS_393, BB40 VSS_395, BB41 VSS_396, BB42 VSS_397, BB43 VSS_398, BB44 VSS_399, BB45 VSS_400, BB46 VSS_401, BB47 VSS_402, BB48 VSS_403, BB49 VSS_404, BB50 VSS_406, BC1 VSS_411, BC7 VSS_427, BC12 VSS_412, BC15 VSS_413, BC18 VSS_414, BC20 VSS_415, BC22 VSS_416, BC33 VSS_417, BC35 VSS_418, BC37 VSS_419, BC39 VSS_420, BC44 VSS_421, BC49 VSS_422, BC51 VSS_423, BC52 VSS_424, BC53 VSS_425, BC54 VSS_426, BD1 VSS_428, BD2 VSS_432, BD3 VSS_436, BD4 VSS_439, BD5 VSS_446, BD7 VSS_449, BD9 VSS_450, BD10 VSS_429, BD12 VSS_430, BD14 VSS_431, BD24 VSS_433, BD26 VSS_434, BD28 VSS_435, BD30 VSS_437, BD39 VSS_438, BD41 VSS_440, BD42 VSS_441, BD44 VSS_442, BD46 VSS_443, BD47 VSS_444, BD49 VSS_445, BD53 VSS_447, BD54 VSS_448, BE1 VSS_451, BE2 VSS_454, BE3 VSS_455, BE7 VSS_463, BE12 VSS_452, BE15 VSS_453, BE39 VSS_456, BE44 VSS_457, BE49 VSS_458, BE51 VSS_459, BE52 VSS_460, BE53 VSS_461, BE54 VSS_462, BF1 VSS_464, BF2 VSS_472, BF3 VSS_478, BF4 VSS_484, BF5 VSS_495, BF7 VSS_500, BF8 VSS_501, BF9 VSS_502, BF10 VSS_465, BF11 VSS_466, BF12 VSS_467, BF13 VSS_468, BF15 VSS_469, BF17 VSS_470, BF19 VSS_471, BF21 VSS_473, BF23 VSS_474, BF25 VSS_475, BF27 VSS_476, BF29 VSS_477, BF31 VSS_479, BF33 VSS_480, BF35 VSS_481, BF37 VSS_482, BF39 VSS_483, BF40 VSS_485, BF41 VSS_486, BF42 VSS_487, BF43 VSS_488, BF44 VSS_489, BF45 VSS_490, BF46 VSS_491, BF47 VSS_492, BF48 VSS_493, BF49 VSS_494, BF51 VSS_496, BF52 VSS_497, BF53 VSS_498, BF54 VSS_499